# Altium footprint library POT_TH.PcbLib: 65 footprints (part 3 of 5)
Each footprint in its own frame and in the unit in brackets; x right, y up, seen from the top. Pads: shape width x height; smd on the part's side, far side on the other; paste and mask are expansions set on the pad; w line width, h text height; cw(c..) or ccw(c..) is an arc to the next point about the centre after c.
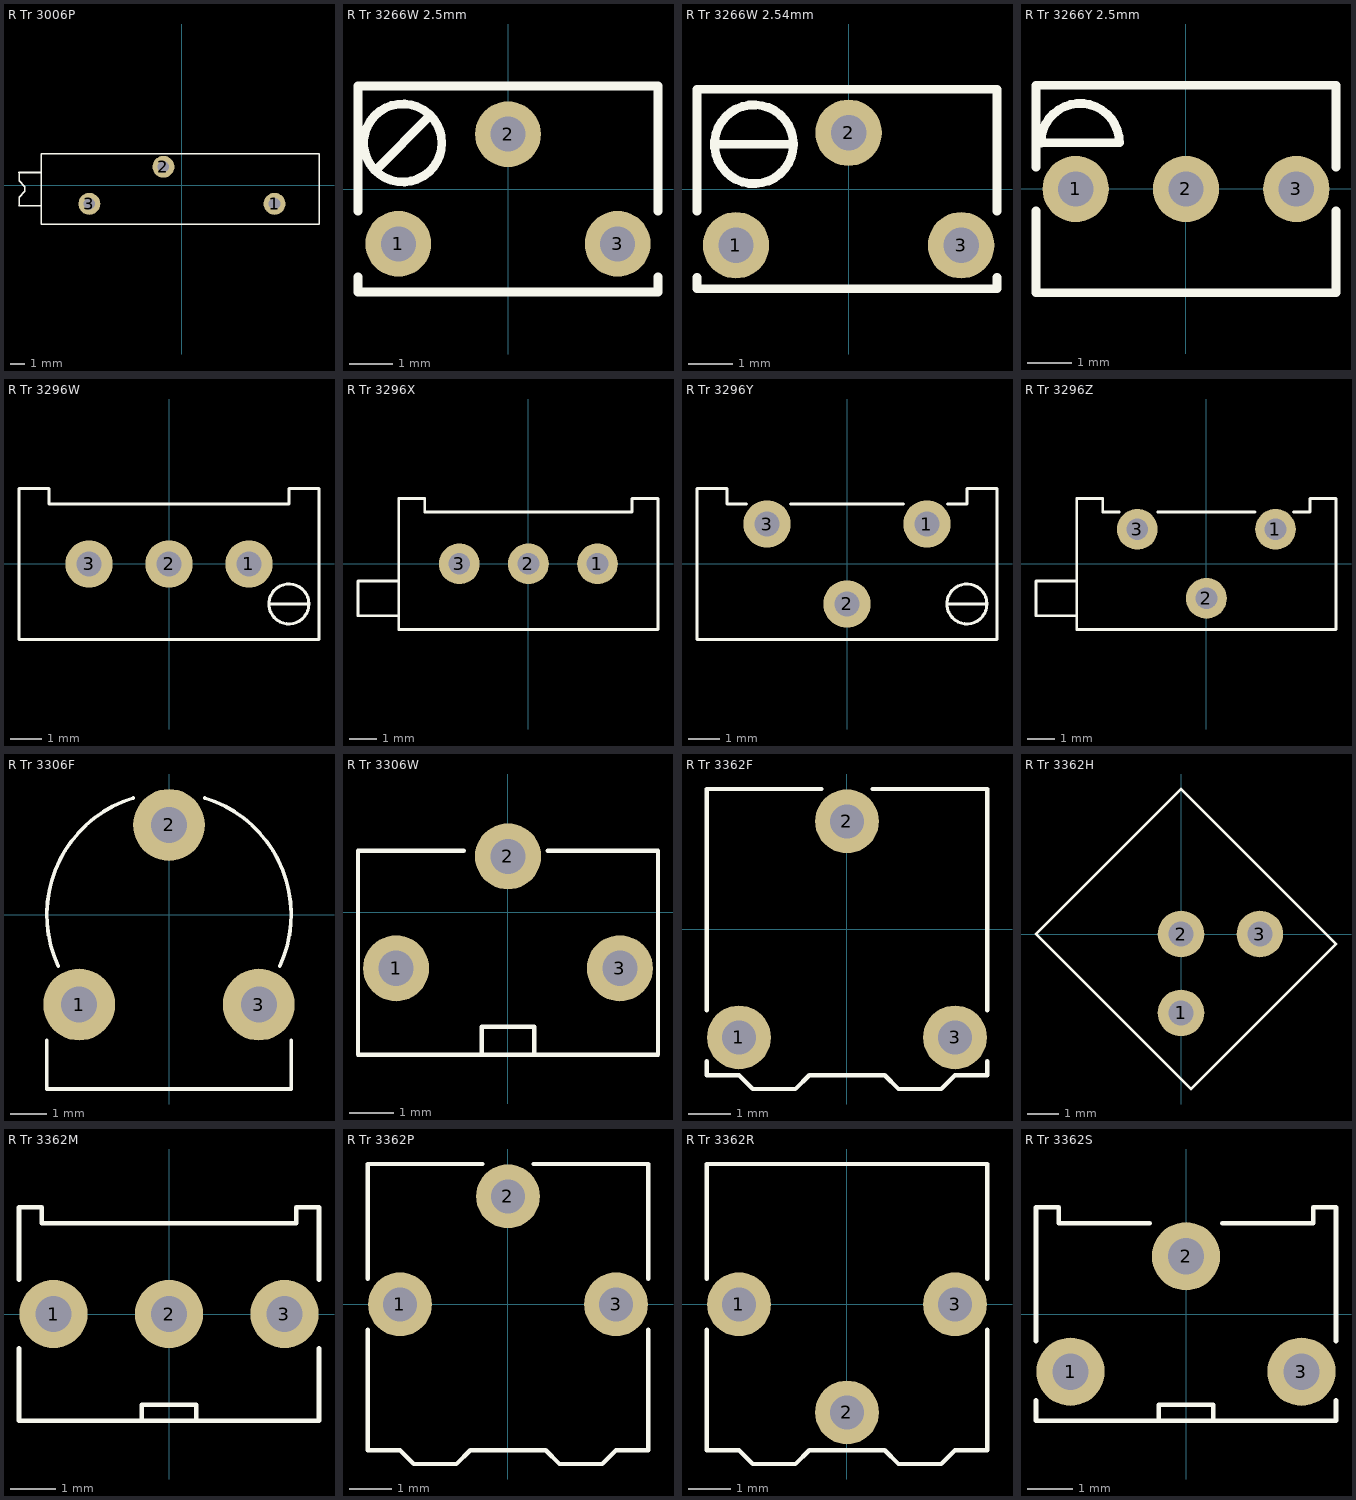
[diagram p2: the footprints below, top view; thin cyan lines are the x and y axes]

## R Tr 3006P [mm]
pads (3):
  round 1.5 hole 0.8: 1(6.35,-1.27) 2(-1.27,1.27) 3(-6.35,-1.27)
Top Overlay:
  lines w0.1: -11.174,-1.397 -11.174,-0.826 -10.77,-0.422 -10.77,-0.086 -11.174,0.318 -11.174,0.889 ; -9.65,-2.667 -9.65,2.16 9.4,2.16 9.4,-2.667 -9.65,-2.667
  lines w0.125: -11.174,-1.397 -9.65,-1.397 ; -11.174,0.889 -9.65,0.889
3D body "Bourns 3006P.STEP": height 6.35, standoff -2.16, extent -11.174,-2.67 9.4,2.16

## R Tr 3266W 2.5mm [mm] "Trimming Potentiometer BOURNS 3266W Series"
height 7.75
pads (3):
  round 1.5 hole 0.8: 1(-2.5,-1.25) 2(0,1.25) 3(2.5,-1.25)
Top Overlay:
  circle w0.2: c-2.4,1.05 r0.89
  lines w0.2: -3.42,-2 -3.42,-2.35 3.38,-2.35 ; -3.42,-0.5 -3.42,2.35 3.38,2.35 ; -3.017,0.425 -1.77,1.679 ; 3.42,-2.35 3.42,-2 ; 3.42,-0.5 3.42,2.35
3D body "Bourns 3266W.STEP": height 8.05, standoff -2.12, extent -3.195,-2.25 3.155,2.25

## R Tr 3266W 2.54mm [mm] "Trimming Potentiometer BOURNS 3266W Series"
height 7.75
pads (3):
  round 1.5 hole 0.8: 1(-2.54,-1.27) 2(0,1.27) 3(2.54,-1.27)
Top Overlay:
  circle w0.2: c-2.135,1.01 r0.89
  lines w0.2: -3.42,-2 -3.42,-2.25 3.35,-2.25 3.35,-2 ; -3.42,-0.5 -3.42,2.25 3.35,2.25 3.35,-0.5 ; -3.025,1.005 -1.245,1.01
3D body "Bourns 3266W.STEP": height 8.05, standoff -2.12, extent -3.195,-2.25 3.155,2.25

## R Tr 3266Y 2.5mm [mm] "Trimming Potentiometer BOURNS 3266W Series"
height 7.75
pads (3):
  round 1.5 hole 0.8: 1(-2.5,0) 2(0,0) 3(2.5,0)
Top Overlay:
  lines w0.2: -3.4,-0.5 -3.4,-2.35 3.4,-2.35 3.4,-0.5 ; -3.4,0.5 -3.4,2.35 3.4,2.35 3.4,0.5 ; -3.29,1.05 cw(c-2.4,1.05) -1.51,1.05 -3.284,1.045
3D body "Bourns 3266W.STEP": height 8.05, standoff -2.12, extent -3.175,-2.25 3.175,2.25

## R Tr 3296W [mm]
pads (3):
  round 1.5 hole 0.8: 1(2.54,0) 2(0,0) 3(-2.54,0)
Top Overlay:
  circle w0.1: c3.81,-1.27 r0.635
  lines w0.1: 3.175,-1.27 4.445,-1.27 ; -4.765,-2.4 4.765,-2.4 4.765,2.4 3.81,2.4 3.81,1.905 -3.81,1.905 -3.81,2.4 -4.765,2.4 -4.765,-2.4
3D body "Bourns 3296W.STEP": height 11.55, standoff -1.6, extent -4.765,-2.4 4.765,2.4

## R Tr 3296X [mm]
pads (3):
  round 1.5 hole 0.8: 1(2.54,0) 2(0,0) 3(-2.54,0)
Top Overlay:
  lines w0.1: -4.765,-1.905 -6.265,-1.905 -6.265,-0.635 -4.765,-0.635 ; -4.765,-2.413 4.765,-2.413 4.765,2.4 3.81,2.4 3.81,1.905 -3.81,1.905 -3.81,2.4 -4.765,2.4 -4.765,-2.413
3D body "Bourns 3296X.STEP": height 10.03, standoff -1.6, extent -6.265,-2.4 4.765,2.4

## R Tr 3296Y [mm]
pads (3):
  round 1.5 hole 0.8: 1(2.54,1.27) 2(0,-1.27) 3(-2.54,1.27)
Top Overlay:
  circle w0.1: c3.81,-1.27 r0.635
  lines w0.1: -3.2,1.905 -3.81,1.905 -3.81,2.4 -4.765,2.4 -4.765,-2.4 4.765,-2.4 4.765,2.4 3.81,2.4 3.81,1.905 3.2,1.905 ; -1.79,1.905 1.79,1.905 ; 3.175,-1.27 4.445,-1.27
3D body "Bourns 3296Y.STEP": height 11.55, standoff -2.1, extent -4.765,-2.4 4.765,2.4

## R Tr 3296Z [mm]
pads (3):
  round 1.5 hole 0.8: 1(2.54,1.27) 2(0,-1.27) 3(-2.54,1.27)
Top Overlay:
  lines w0.1: -4.765,-1.905 -6.265,-1.905 -6.265,-0.635 -4.765,-0.635 ; -3.2,1.905 -3.81,1.905 -3.81,2.4 -4.765,2.4 -4.765,-2.413 4.765,-2.413 4.765,2.4 ; -1.79,1.905 1.79,1.905 ; 3.2,1.905 3.81,1.905 3.81,2.4 4.765,2.4 ; 4.765,2.4 4.765,2.4
3D body "Bourns 3296Z.STEP": height 10.03, standoff -1.6, extent -6.265,-2.4 4.765,2.4

## R Tr 3306F [mm]
pads (3):
  round 2 hole 1: 1(-2.5,-2.5) 2(0,2.5) 3(2.5,-2.5)
Top Overlay:
  lines w0.1: -3.4,-3.5 -3.4,-4.85 3.4,-4.85 3.4,-3.5 ; -3.081,-1.437 cw(c0,0) -1,3.25 ; 1,3.25 cw(c0,0) 3.081,-1.437
3D body "Bourns 3306F.STEP": height 7.62, standoff -1.94, extent -3.405,-4.876 3.405,3.375

## R Tr 3306W [mm]
pads (3):
  round 1.5 hole 0.8: 1(-2.54,-1.27) 2(0,1.27) 3(2.54,-1.27)
Top Overlay:
  lines w0.1: -1,1.4 -3.405,1.4 -3.405,-3.23 3.405,-3.23 3.405,1.4 0.9,1.4 ; -0.6,-3.23 -0.6,-2.6 0.6,-2.6 0.6,-3.23
3D body "Bourns 3306W.STEP": height 8.4, standoff -1.91, extent -3.405,-1.73 3.405,1.42

## R Tr 3362F [mm]
pads (3):
  round 1.5 hole 0.8: 1(-2.54,-2.54) 2(0,2.54) 3(2.54,-2.54)
Top Overlay:
  lines w0.1: -3.3,-1.9 -3.3,3.3 ; -3.3,3.3 -0.6,3.3 ; 0.6,3.3 3.3,3.3 ; 3.3,-3.429 3.3,-3.1 ; 3.3,-1.9 3.3,3.3 ; 3.3,-3.429 2.54,-3.429 2.215,-3.754 1.214,-3.754 0.889,-3.429 -0.889,-3.429 -1.214,-3.754 -2.215,-3.754 -2.54,-3.429 -3.3,-3.429 -3.3,-3.1 ; -3.3,-3.1 -3.3,-3.1 ; 3.3,-3.1 3.3,-3.1
3D body "Bourns 3362F.STEP": height 4.7, standoff -2.17, extent -3.3,-3.754 3.3,3.3

## R Tr 3362H [mm]
pads (3):
  round 1.5 hole 0.8: 1(0,-2.54) 2(0,0) 3(2.54,0)
Top Overlay:
  lines w0.1: -4.667,0 0,4.667 4.988,-0.321 0.321,-4.988 -4.667,0
3D body "Bourns 3362H.STEP": height 4.7, standoff -2.17, extent -4.667,-4.988 4.988,4.667

## R Tr 3362M [mm]
pads (3):
  round 1.5 hole 0.8: 1(-2.54,0) 2(0,0) 3(2.54,0)
Top Overlay:
  lines w0.1: -3.3,-0.75 -3.3,-2.35 3.3,-2.35 3.3,-0.75 ; -3.3,0.75 -3.3,2.35 -2.8,2.35 -2.8,2 2.8,2 2.8,2.35 3.3,2.35 3.3,0.75 ; -0.6,-2.35 -0.6,-2 0.6,-2 0.6,-2.35
3D body "Bourns 3362M.STEP": height 7.05, standoff -1.84, extent -3.3,-2.35 3.3,2.35

## R Tr 3362P [mm]
pads (3):
  round 1.5 hole 0.8: 1(-2.54,0) 2(0,2.54) 3(2.54,0)
Top Overlay:
  lines w0.1: -3.3,-0.6 -3.3,-3.429 -2.54,-3.429 -2.215,-3.754 -1.214,-3.754 -0.889,-3.429 0.889,-3.429 1.214,-3.754 2.215,-3.754 2.54,-3.429 3.3,-3.429 ; -3.3,0.6 -3.3,3.3 ; -3.3,3.3 -0.6,3.3 ; 0.6,3.3 3.3,3.3 ; 3.3,-3.429 3.3,-0.6 ; 3.3,0.6 3.3,3.3
3D body "Bourns 3362P.STEP": height 4.7, standoff -2.17, extent -3.3,-3.754 3.3,3.3

## R Tr 3362R [mm]
pads (3):
  round 1.5 hole 0.8: 1(-2.54,0) 2(0,-2.54) 3(2.54,0)
Top Overlay:
  lines w0.1: -3.3,-0.6 -3.3,-3.429 -2.54,-3.429 -2.215,-3.754 -1.214,-3.754 -0.889,-3.429 0.889,-3.429 1.214,-3.754 2.215,-3.754 2.54,-3.429 3.3,-3.429 ; -3.3,0.6 -3.3,3.3 ; -3.3,3.3 3.3,3.3 ; 3.3,-3.429 3.3,-0.6 ; 3.3,0.6 3.3,3.3
3D body "Bourns 3362R.STEP": height 4.7, standoff -2.17, extent -3.3,-3.754 3.3,3.3

## R Tr 3362S [mm]
pads (3):
  round 1.5 hole 0.8: 1(-2.54,-1.27) 2(0,1.27) 3(2.54,-1.27)
Top Overlay:
  lines w0.1: -3.3,-1.9 -3.3,-2.35 3.3,-2.35 3.3,-1.9 ; -3.3,-0.6 -3.3,2.35 -2.8,2.35 -2.8,2 -0.8,2 ; -0.6,-2.35 -0.6,-2 0.6,-2 0.6,-2.35 ; 0.8,2 2.8,2 2.8,2.35 3.3,2.35 3.3,-0.6
3D body "Bourns 3362S.STEP": height 7.05, standoff -2.05, extent -3.3,-2.35 3.3,2.35